# Altium footprint library General.PCBLIB: 130 footprints (part 9 of 9)
Each footprint in its own frame and in the unit in brackets; x right, y up, seen from the top. Pads: shape width x height; smd on the part's side, far side on the other; paste and mask are expansions set on the pad; w line width, h text height; cw(c..) or ccw(c..) is an arc to the next point about the centre after c.
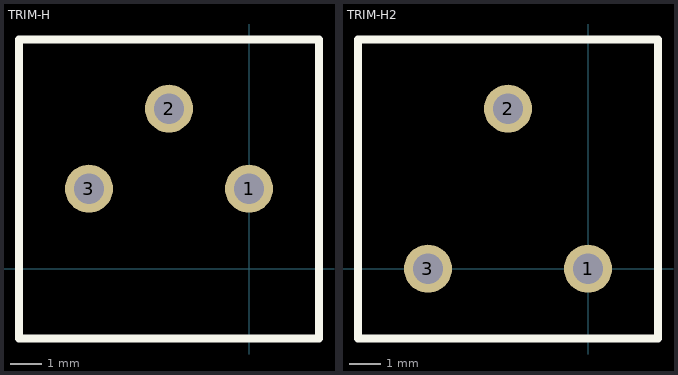
[diagram p8: the footprints below, top view; thin cyan lines are the x and y axes]

## TRIM-H [mil]
pads (3):
  round 60 hole 38: 1(0,100) 2(-100,200) 3(-200,100)
Top Overlay:
  lines w10: -287.4,-87.4 87.4,-87.4 87.4,286.61 -287.4,286.61 -287.4,-87.4
Top DesignatorDoc:
  text ".Designator" at -100,100 h47.24
3D body "SW3DPS-CERMET TRIMMER SINGLE TURN 10MM 500MW TOP ADJUST-DEFAULT.step": height 190.76, standoff -196.25, extent -287.6,-90 87.6,285.2

## TRIM-H2 [mil]
pads (3):
  round 60 hole 38: 1(0,0) 2(-100,200) 3(-200,0)
Top Overlay:
  lines w10: -287.4,-87.4 -287.4,286.61 87.4,286.61 87.4,-87.4 -287.4,-87.4
Top DesignatorDoc:
  text ".Designator" at -100,75 h47.24
3D body "SW3DPS-CERMET TRIMMER SINGLE TURN 10MM 500MW TOP ADJUST-DEFAULT.step": height 190.76, standoff -196.25, extent -290.2,-87.6 85,287.6